# Altium footprint library Velotour_2022.PcbLib: 30 footprints (part 1 of 2)
Each footprint in its own frame and in the unit in brackets; x right, y up, seen from the top. Pads: shape width x height; smd on the part's side, far side on the other; paste and mask are expansions set on the pad; w line width, h text height; cw(c..) or ccw(c..) is an arc to the next point about the centre after c.
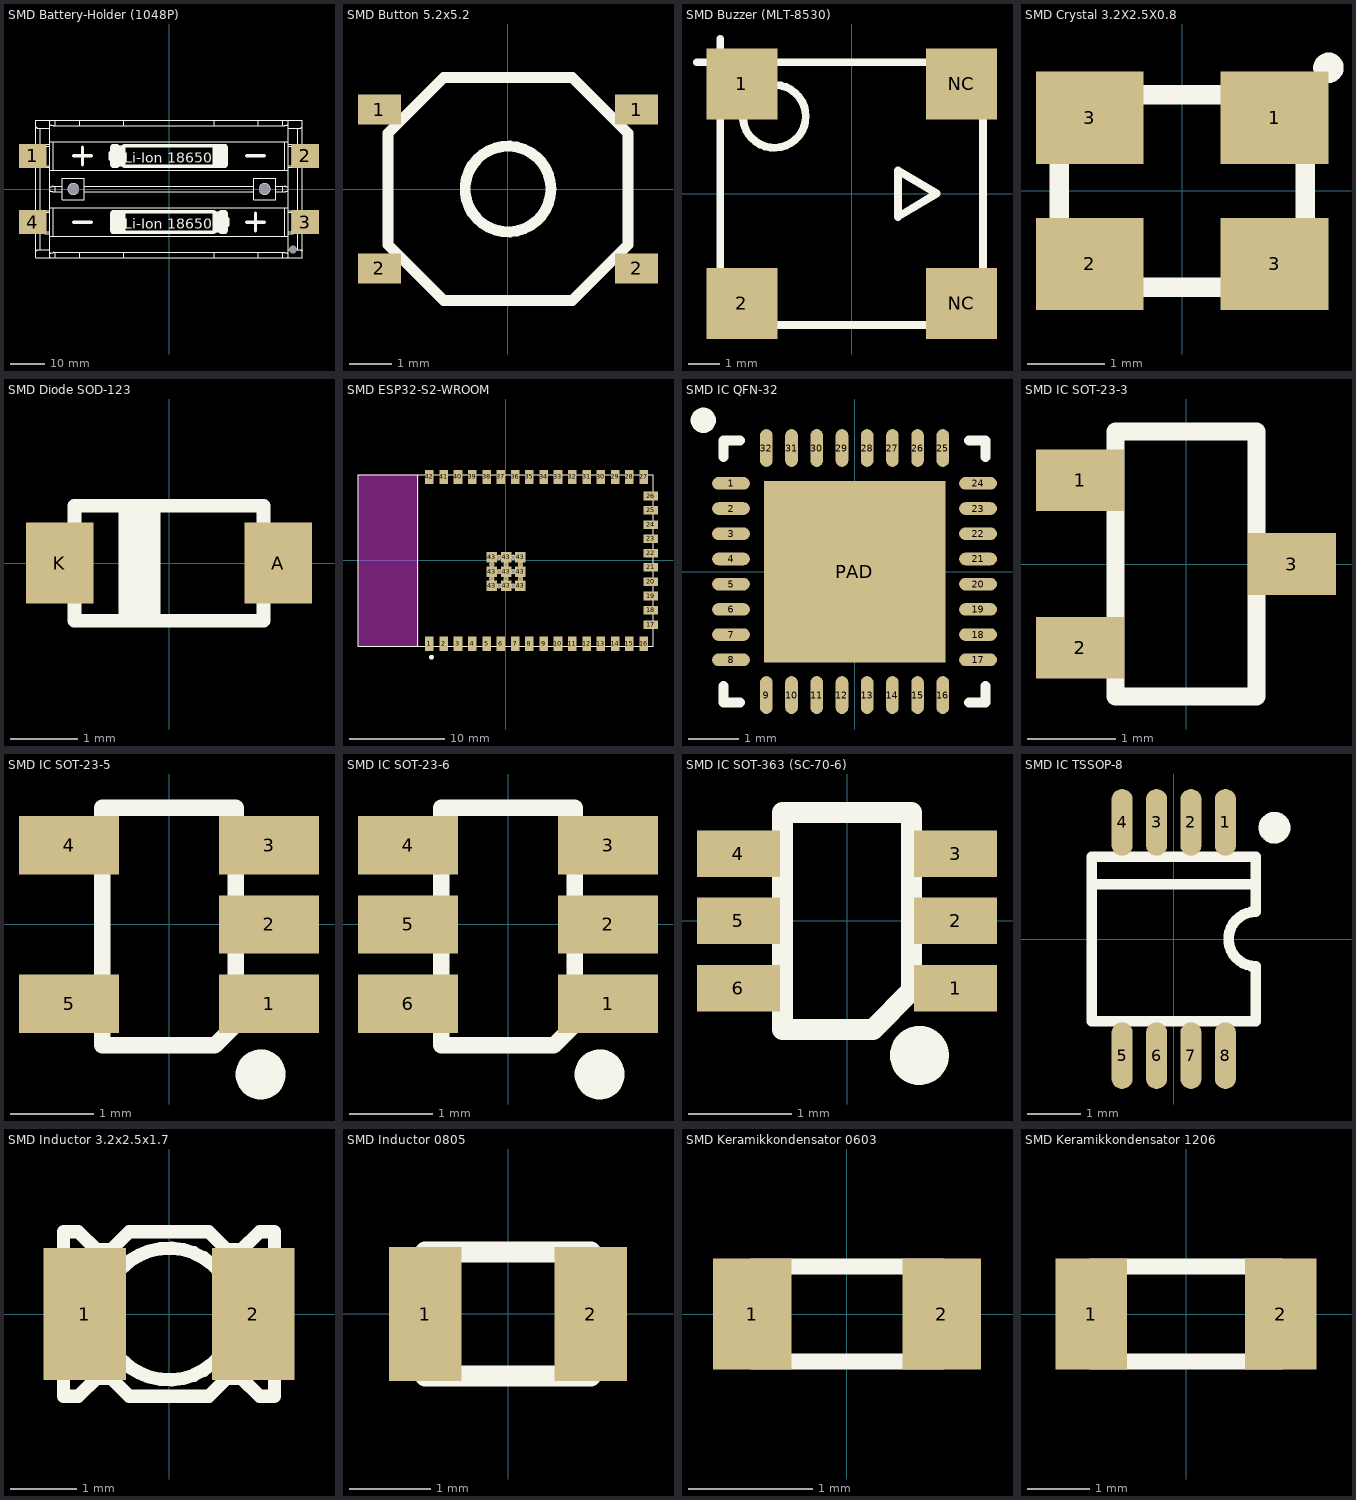
[diagram p0: the footprints below, top view; thin cyan lines are the x and y axes]

## SMD Battery-Holder (1048P) [mm]
pads (7):
  rect 8x7 smd: 1(-39.35,9.55) 2(39.35,9.55) 3(39.35,-9.55) 4(-39.35,-9.55)
  round 0 hole 3.2 unplated: NC(-27.6,0) NC(27.6,0)
  round 0 hole 2.4 unplated: NC(35.85,-17.5)
Top Overlay:
  drawing of 7051 lines, arcs and shapes, not listed
  text "Li-Ion 18650" at -13,6.55 h5
  text "Li-Ion 18650" at -13,-12.55 h5
3D body "INR18650-35E.step": height 18.65, standoff 0.35, extent -32.851,0.4 32.851,18.7
3D body "User Library-Blossom 1048.x_t": height 14.88, standoff -1.53, extent -43.002,-19.888 43.002,19.888
3D body "INR18650-35E.step": height 18.65, standoff 0.35, extent -32.851,-18.7 32.851,-0.4

## SMD Button 5.2x5.2 [mm]
pads (4):
  rect 1x0.7 smd: 1(-3,1.85) 1(3,1.85) 2(-3,-1.85) 2(3,-1.85)
Top Overlay:
  circle w0.254: c0,0 r1
  lines w0.254: -2.8,-1.3 -1.5,-2.6 0,-2.6 1.5,-2.6 2.8,-1.3 2.8,0 2.8,1.3 1.5,2.6 0,2.6 -1.5,2.6 -2.8,1.3 -2.8,0 -2.8,-1.3
3D body "User Library-LP16.step": height 1.5, standoff 0, extent -3.2,-2.55 3.2,2.55

## SMD Buzzer (MLT-8530) [mm] "SMD_LED_RED"
height 8.65
pads (4):
  rect 2.3x2.3 smd: 1(-3.55,3.55) 2(-3.55,-3.55) NC(3.55,-3.55) NC(3.55,3.55)
Top Overlay:
  circle w0.254: c-2.5,2.5 r1.016
  lines w0.254: -5,4.25 -3.5,4.25 ; -4.25,3.5 -4.25,5 ; -4.25,-2.75 -2.75,-4.25 0,-4.25 2.75,-4.25 4.25,-2.75 4.25,0 4.25,2.75 2.75,4.25 0,4.25 -2.75,4.25 -4.25,2.75 -4.25,0 -4.25,-2.75 ; 1.5,-0.75 2.75,0 1.5,0.75 1.5,-0.75
3D body "User Library-MLT-8530.x_t": height 3, standoff 0, extent -4.25,-4.25 4.25,4.25

## SMD Crystal 3.2X2.5X0.8 [mm] "SMD_LED_RED"
height 8.65
pads (4):
  rect 1.4x1.2 smd: 1(1.2,0.95) 2(-1.2,-0.95) 3(-1.2,0.95) 3(1.2,-0.95)
Top Overlay:
  circle w0.2: c1.9,1.6 r0.098
  lines w0.254: -1.6,-1.25 -1.6,1.25 1.6,1.25 1.6,-1.25 -1.6,-1.25
3D body "User Library-Crystal TXC Corp 7M series.step": height 0.8, standoff 0, extent -1.65,-1.3 1.65,1.3

## SMD Diode SOD-123 [mm] "SM LED; 2 Flat Leads"
height 1.3
pads (2):
  rect 1x1.2 smd: A(1.62,0) K(-1.62,0)
Top Overlay:
  region: -0.125,0.875 -0.75,0.875 -0.75,-0.9 -0.125,-0.9
  lines w0.2: -1.4,-0.85 1.4,-0.85 ; -1.4,0.85 1.4,0.85
  lines w0.203: -1.4,-0.85 -1.4,0.85 ; 1.4,-0.85 1.4,0.85
3D body "User Library-SOD-123_DiodesInc.step": height 1.42, standoff -0.03, extent -1.925,-0.85 1.925,0.85

## SMD ESP32-S2-WROOM [mm]
height 1.7
pads (63):
  rect 0.9x1.5 smd: 1(-8,-8.75) 2(-6.5,-8.75) 3(-5,-8.75) 4(-3.5,-8.75) 5(-2,-8.75) 6(-0.5,-8.75) 7(1,-8.75) 8(2.5,-8.75) 9(4,-8.75) 10(5.5,-8.75) 11(7,-8.75) 12(8.5,-8.75) 13(10,-8.75) 14(11.5,-8.75) 15(13,-8.75) 16(14.5,-8.75) 27(14.5,8.75) 28(13,8.75) 29(11.5,8.75) 30(10,8.75) 31(8.5,8.75) 32(7,8.75) 33(5.5,8.75) 34(4,8.75) 35(2.5,8.75) 36(1,8.75) 37(-0.5,8.75) 38(-2,8.75) 39(-3.5,8.75) 40(-5,8.75) 41(-6.5,8.75) 42(-8,8.75)
  rect 1.5x0.9 smd: 17(15.25,-6.75) 18(15.25,-5.25) 19(15.25,-3.75) 20(15.25,-2.25) 21(15.25,-0.75) 22(15.25,0.75) 23(15.25,2.25) 24(15.25,3.75) 25(15.25,5.25) 26(15.25,6.75)
  rect 1.1x1.1 smd: 43(-1.45,-2.69) 43(-1.45,-1.19) 43(-1.45,0.31) 43(0.05,-2.69) 43(0.05,-1.19) 43(0.05,0.31) 43(1.55,-2.69) 43(1.55,-1.19) 43(1.55,0.31)
  round 0.55 hole 0.3 mask+0.102: 43(-1.45,-1.94) 43(-1.45,-0.44) 43(-0.7,-2.69) 43(-0.7,-1.19) 43(-0.7,0.31) 43(0.05,-1.94) 43(0.05,-0.44) 43(0.8,-2.69) 43(0.8,-1.19) 43(0.8,0.31) 43(1.55,-1.94) 43(1.55,-0.44)
Top Overlay:
  circle w0.3: c-7.788,-10.177 r0.1
  lines w0.127: -9.2,-8.96 -9.2,9 ; -9.2,9 -15.5,9 -15.5,-9 15.5,-9 15.5,9 -9.2,9
Keep-Out Layer:
  region: -9.2,9 -9.2,-9 -15.5,-9 -15.5,9
  region: -9.2,9 -9.2,-9 -15.5,-9 -15.5,9
  region: -9.2,9 -9.2,-9 -15.5,-9 -15.5,9
3D body "step_temp.STEP": height 3.3, standoff 0, extent -15.45,-9 15.55,9

## SMD IC QFN-32 [mm] "QFN, 32-Leads, Body 5x5mm, Pitch 0.5mm, IPC Medium Density"
height 1
pads (33):
  oval 0.75x0.25 smd: 1(-2.45,1.75) 2(-2.45,1.25) 3(-2.45,0.75) 4(-2.45,0.25) 5(-2.45,-0.25) 6(-2.45,-0.75) 7(-2.45,-1.25) 8(-2.45,-1.75) 17(2.45,-1.75) 18(2.45,-1.25) 19(2.45,-0.75) 20(2.45,-0.25) 21(2.45,0.25) 22(2.45,0.75) 23(2.45,1.25) 24(2.45,1.75)
  oval 0.25x0.75 smd: 9(-1.75,-2.45) 10(-1.25,-2.45) 11(-0.75,-2.45) 12(-0.25,-2.45) 13(0.25,-2.45) 14(0.75,-2.45) 15(1.25,-2.45) 16(1.75,-2.45) 25(1.75,2.45) 26(1.25,2.45) 27(0.75,2.45) 28(0.25,2.45) 29(-0.25,2.45) 30(-0.75,2.45) 31(-1.25,2.45) 32(-1.75,2.45)
  rect 3.6x3.6 smd: PAD(0,0)
Top Overlay:
  circle w0.25: c-3,3 r0.125
  lines w0.2: -2.6,-2.275 -2.6,-2.6 -2.275,-2.6 ; -2.6,2.275 -2.6,2.6 -2.275,2.6 ; 2.275,-2.6 2.6,-2.6 2.6,-2.275 ; 2.275,2.6 2.6,2.6 2.6,2.275
3D body "User Library-qfn32-5x5.x_b": height 0.8, standoff 0, extent -2.51,-2.51 2.51,2.51

## SMD IC SOT-23-3 [mm]
pads (3):
  rect 1x0.7 smd: 1(-1.2,0.95) 2(-1.2,-0.95) 3(1.2,0)
Top Overlay:
  lines w0.203: -0.8,-1.5 -0.8,1.5 0.8,1.5 0.8,-1.5 -0.8,-1.5
3D body "CircuitWorks-SOT-23.step": height 1.1, standoff 0, extent -1.301,-1.5 1.199,1.5

## SMD IC SOT-23-5 [mm] "SOT-223/SC-73; 4 Leads; Body 6.7 x 7.3 mm, inc. leads (LxW max)"
height 1.8
pads (5):
  rect 1.2x0.7 smd: 1(1.2,-0.95) 2(1.2,0) 3(1.2,0.95) 4(-1.2,0.95) 5(-1.2,-0.95)
Top Overlay:
  circle w0.4: c1.1,-1.8 r0.1
  lines w0.2: -0.8,-1.45 -0.8,1.4 0.8,1.4 0.8,-1.2 0.55,-1.45 -0.8,-1.45
3D body "CircuitWorks-SOT-23-5.step": height 1.1, standoff 0, extent -1.301,-1.5 1.199,1.5

## SMD IC SOT-23-6 [mm] "SOT-223/SC-73; 4 Leads; Body 6.7 x 7.3 mm, inc. leads (LxW max)"
height 1.8
pads (6):
  rect 1.2x0.7 smd: 1(1.2,-0.95) 2(1.2,0) 3(1.2,0.95) 4(-1.2,0.95) 5(-1.2,0) 6(-1.2,-0.95)
Top Overlay:
  circle w0.4: c1.1,-1.8 r0.1
  lines w0.2: -0.8,-1.45 0.55,-1.45 0.8,-1.2 0.8,1.4 -0.8,1.4 -0.8,-1.45
3D body "User Library-SOT23-6-2.step": height 1.45, standoff 0, extent -1.4,-1.45 1.4,1.45

## SMD IC SOT-363 (SC-70-6) [mm]
height 1.7
pads (6):
  rect 0.8x0.45 smd: 1(1.05,-0.65) 2(1.05,0) 3(1.05,0.65) 4(-1.05,0.65) 5(-1.05,0) 6(-1.05,-0.65)
Top Overlay:
  circle w0.37: c0.7,-1.3 r0.1
  lines w0.203: -0.625,-1.05 0.25,-1.05 0.625,-0.675 0.625,1.05 -0.625,1.05 -0.625,-1.05
3D body "User Library-SC70-6.step": height 0.92, standoff -0.03, extent -1.05,-1 1.05,1

## SMD IC TSSOP-8 [mm] "Shrink Small Outline; 16 Leads; Body Width 4.4 mm; Pitch 0.65 mm"
height 1.1
pads (8):
  oval 0.4x1.26 smd: 1(0.975,2.2) 2(0.325,2.2) 3(-0.325,2.2) 4(-0.975,2.2) 5(-0.975,-2.2) 6(-0.325,-2.2) 7(0.325,-2.2) 8(0.975,-2.2)
Top Overlay:
  circle w0.35: c1.9,2.1 r0.125
  lines w0.2: -1.55,1.033 1.55,1.033 ; -1.55,-1.55 1.55,-1.55 1.55,-0.517 cw(c1.55,0) 1.55,0.517 1.55,1.55 -1.55,1.55 -1.55,-1.55
3D body "User Library-TSSOP-8 3_1x3_1.X_T": height 1.07, standoff -0.03, extent -1.55,-2.5 1.55,2.5

## SMD Inductor 3.2x2.5x1.7 [mm]
pads (2):
  rect 1.25x2 smd: 1(-1.275,0) 2(1.275,0)
Top Overlay:
  circle w0.203: c0,0 r1
  lines w0.203: -1.6,-1.25 -1.375,-1.25 -1.1,-0.975 -0.875,-0.975 -0.6,-1.25 0,-1.25 0.6,-1.25 0.875,-0.975 1.1,-0.975 1.375,-1.25 1.6,-1.25 1.6,1.25 1.375,1.25 1.1,0.975 0.875,0.975 0.6,1.25 0,1.25 -0.6,1.25 -0.875,0.975 -1.1,0.975 -1.375,1.25 -1.6,1.25 -1.6,-1.25
3D body "User Library-LQH32PN_sw.x_b": height 1.55, standoff 0, extent -1.6,-1.25 1.6,1.25

## SMD Inductor 0805 [mil]
height 66.93
pads (2):
  rect 35x65 smd: 1(-40,0) 2(40,0)
Top Overlay:
  lines w10: -40,-30 -40,30 40,30 40,-30 -40,-30
3D body "User Library-ind_0805.step": height 37.4, standoff 0, extent -39.36,-23.62 39.38,23.63

## SMD Keramikkondensator 0603 [mil]
height 66.93
pads (2):
  rect 25x35 smd: 1(-30,0) 2(30,0)
Top Overlay:
  lines w5: -30,-15 30,-15 30,15 -30,15 -30,-15
3D body "User Library-0603_Cap.STEP": height 31.69, standoff 0, extent -31.49,-15.74 31.5,15.75

## SMD Keramikkondensator 1206 [mil]
pads (2):
  rect 45x70 smd: 1(-60,0) 2(60,0)
Top Overlay:
  lines w10: -60,-30 -60,30 60,30 60,-30 -60,-30
3D body "User Library-1206 SMD Capacitor.step": height 39.45, standoff 0, extent -62.98,-31.49 63,31.51